# Altium footprint library CUSTOM PCB.PcbLib: 404 footprints (part 16 of 26)
Each footprint in its own frame and in the unit in brackets; x right, y up, seen from the top. Pads: shape width x height; smd on the part's side, far side on the other; paste and mask are expansions set on the pad; w line width, h text height; cw(c..) or ccw(c..) is an arc to the next point about the centre after c.
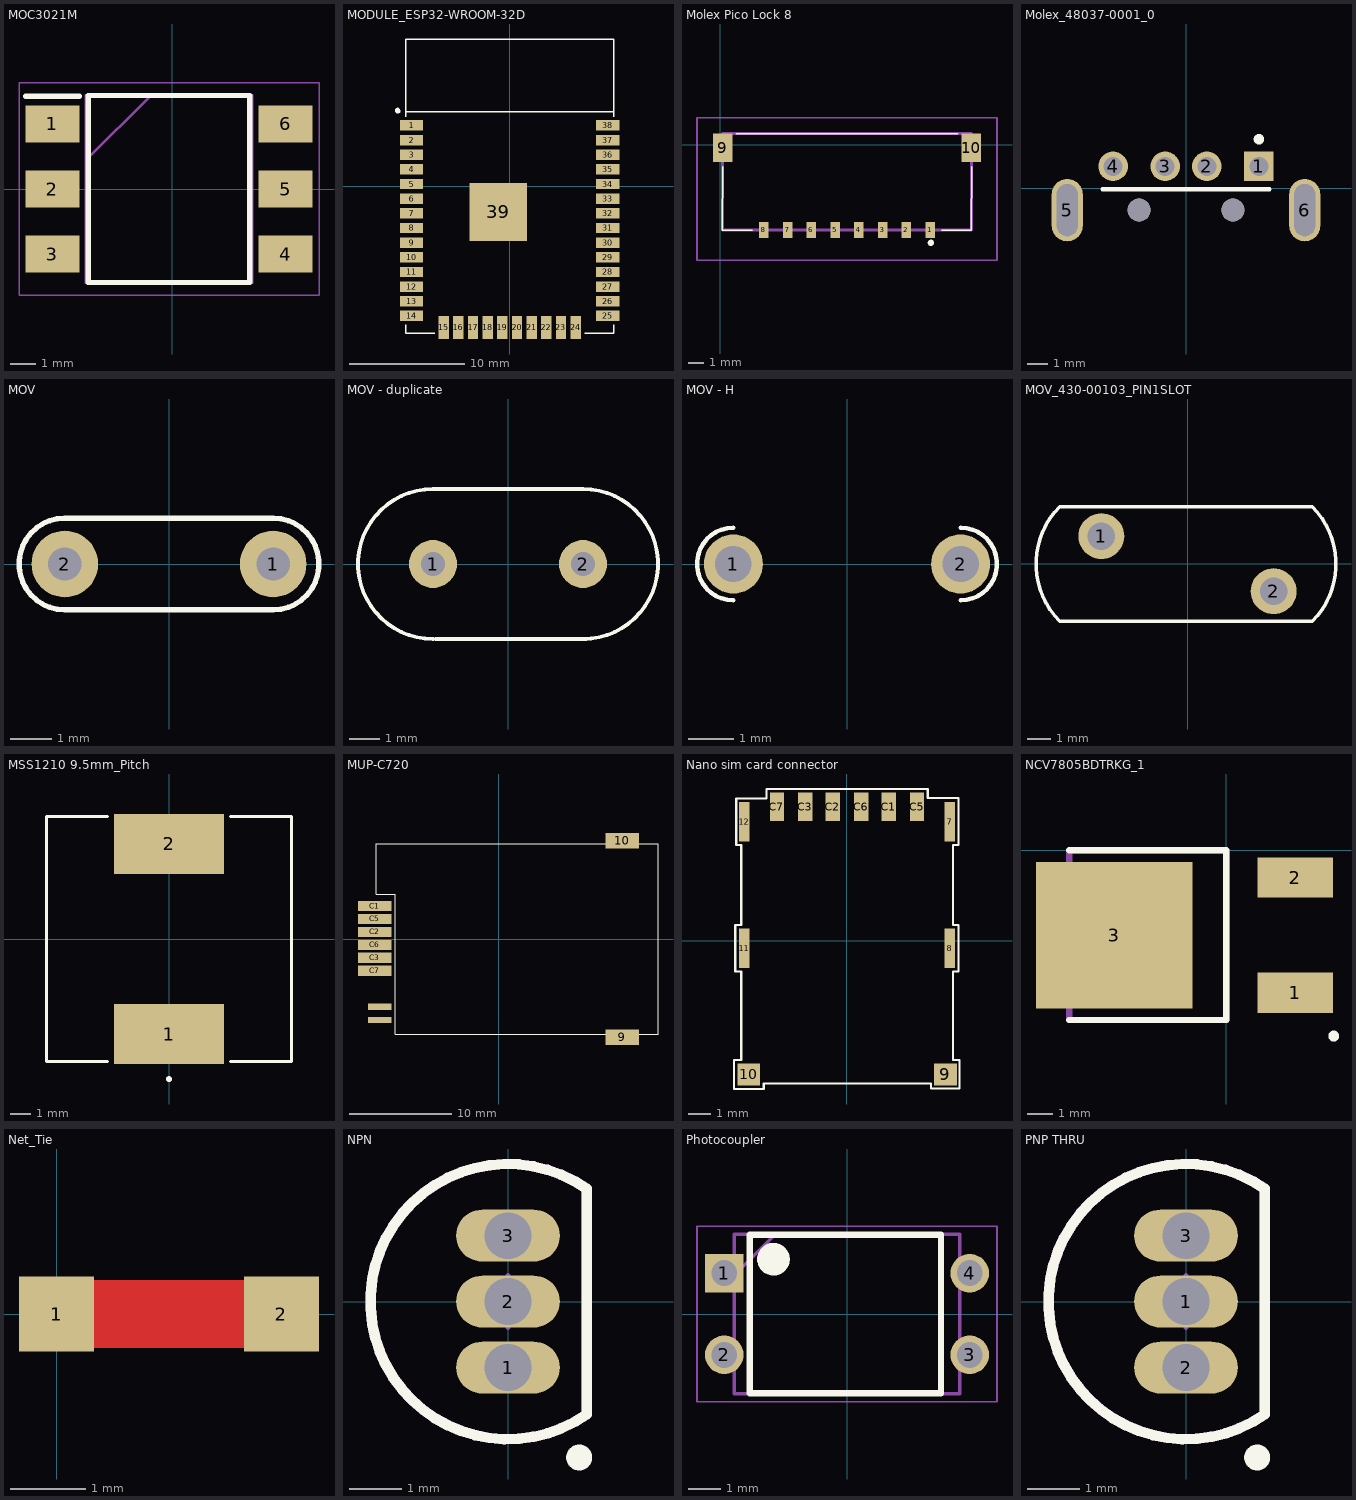
[diagram p15: the footprints below, top view; thin cyan lines are the x and y axes]

## MOC3021M [mm] "Smd Package Lite on"
pads (6):
  rect 2.1x1.45 smd: 1(-4.677,2.54) 2(-4.677,0) 3(-4.677,-2.54) 4(4.423,-2.54) 5(4.423,0) 6(4.423,2.54)
Top Overlay:
  lines w0.2: -5.727,3.615 -3.627,3.615 ; -3.277,-3.65 -3.277,3.65 3.023,3.65 3.023,-3.65 -3.277,-3.65
Mechanical 15:
  lines w0.1: -3.377,1.11 -0.837,3.65 ; -3.377,-3.65 -3.377,3.65 3.123,3.65 3.123,-3.65 -3.377,-3.65
Mechanical 20:
  lines w0.05: -5.977,-4.15 -5.977,4.15 5.723,4.15 5.723,-4.15 -5.977,-4.15
3D body "MOC3021S.stp": height 4, standoff 0, extent -5.08,-3.65 5.08,3.65

## MODULE_ESP32-WROOM-32D [mm]
pads (39):
  rect 2x0.9 smd: 1(-8.5,5.26) 2(-8.5,3.99) 3(-8.5,2.72) 4(-8.5,1.45) 5(-8.5,0.18) 6(-8.5,-1.09) 7(-8.5,-2.36) 8(-8.5,-3.63) 9(-8.5,-4.9) 10(-8.5,-6.17) 11(-8.5,-7.44) 12(-8.5,-8.71) 13(-8.5,-9.98) 14(-8.5,-11.25) 25(8.5,-11.25) 26(8.5,-9.98) 27(8.5,-8.71) 28(8.5,-7.44) 29(8.5,-6.17) 30(8.5,-4.9) 31(8.5,-3.63) 32(8.5,-2.36) 33(8.5,-1.09) 34(8.5,0.18) 35(8.5,1.45) 36(8.5,2.72) 37(8.5,3.99) 38(8.5,5.26)
  rect 0.9x2 smd: 15(-5.715,-12.25) 16(-4.445,-12.25) 17(-3.175,-12.25) 18(-1.905,-12.25) 19(-0.635,-12.25) 20(0.635,-12.25) 21(1.905,-12.25) 22(3.175,-12.25) 23(4.445,-12.25) 24(5.715,-12.25)
  rect 5x5 smd: 39(-1,-2.24)
Top Overlay:
  lines w0.127: -9,-12 -9,-12.75 -6.5,-12.75 ; -9,6 -9,12.75 9,12.75 9,6 ; -8.96,6.45 8.96,6.45 ; 6.5,-12.75 9,-12.75 9,-12
  lines w0.3: -9.649,6.634 ccw(c-9.691,6.543) -9.591,6.543
Top Paste:
  region: -2.584,-0.659 0.581,-0.659 0.581,-3.825 -2.584,-3.825
3D body "ESP32-WROOM-32D--3DModel-STEP-56544.STEP": height 3.25, standoff 0, extent -8.949,-12.75 9.051,12.75

## Molex Pico Lock 8 [mm]
pads (10):
  rect 0.6x1 smd: 1(13.251,-5.384) 2(11.751,-5.384) 3(10.251,-5.384) 4(8.751,-5.384) 5(7.251,-5.384) 6(5.751,-5.384) 7(4.251,-5.384) 8(2.751,-5.384)
  rect 1.25x1.8 smd: 9(0.146,-0.194) 10(15.856,-0.194)
Top Overlay:
  lines w0.1: 0.146,-1.394 0.126,-5.384 2.001,-5.394 ; 1.001,0.706 15.001,0.706 ; 14.001,-5.394 15.856,-5.394 15.876,-1.394
  lines w0.2: 13.201,-6.194 ccw(c13.301,-6.194) 13.401,-6.194 ccw(c13.301,-6.194) 13.201,-6.194
Mechanical 15:
  lines w0.2: 0.126,-5.394 0.126,0.706 15.876,0.706 15.876,-5.394 0.126,-5.394
Mechanical 20:
  lines w0.1: -1.479,-7.294 -1.479,1.706 17.481,1.706 17.481,-7.294 -1.479,-7.294
3D body "5040500891.stp": height 1.89, standoff -0.11, extent -0.274,-5.588 16.276,0.852

## Molex_48037-0001_0 [mm]
pads (8):
  rect 1.42x1.42 hole 0.92 paste-1000 mask+0: 1(3.5,1.05)
  round 1.42 hole 0.92 paste-1000 mask+0: 2(1,1.05) 3(-1,1.05) 4(-3.5,1.05)
  oval 1.5x3 hole 1 slot 2.5 at 90 deg paste-1000 mask+0: 5(-5.7,-1.05) 6(5.7,-1.05)
  round 1.1 hole 1.1 unplated paste-1000 mask+0: ""(-2.25,-1.05) ""(2.25,-1.05)
Top Overlay:
  circle w0.25: c3.5,2.35 r0.125
  lines w0.2: -4,-0.05 4,-0.05
3D body "14380.x_t": height 3, standoff -2.8, extent -6.303,-18.763 6.303,1.162

## MOV [mm]
pads (2):
  round 1.6 hole 0.8: 1(2.5,0) 2(-2.5,0)
Top Overlay:
  lines w0.127: -2.5,-1.1 cw(c-2.5,0) -2.5,1.1 2.5,1.1 cw(c2.5,0) 2.5,-1.1 -2.5,-1.1

## MOV - duplicate [mm]
pads (2):
  round 1.6 hole 0.8: 1(-2.5,0) 2(2.5,0)
Top Overlay:
  lines w0.127: -2.5,-2.5 cw(c-2.5,0) -2.5,2.5 2.5,2.5 cw(c2.5,0) 2.5,-2.5 ; -2.4,-2.5 2.6,-2.5

## MOV - H [mm]
pads (2):
  round 1.3 hole 0.8: 1(-2.5,0) 2(2.5,0)
Top Overlay:
  lines w0.1: -2.5,-0.8 cw(c-2.5,0) -2.5,0.8 ; 2.5,-0.8 ccw(c2.5,0) 2.5,0.8

## MOV_430-00103_PIN1SLOT [mm]
pads (2):
  round 2 hole 1.2: 1(-3.75,1.2) 2(3.75,-1.2)
Top Overlay:
  lines w0.15: -5.57,2.477 ccw(c-3.075,-0.013) -5.565,-2.507 5.435,-2.507 ccw(c2.94,-0.018) 5.43,2.477 -5.57,2.477
Mechanical 15:
  text "1" at -3.75,0.946 h0.64
  text "2" at 3.75,-1.454 h0.64

## MSS1210 9.5mm_Pitch [mil]
pads (2):
  rect 217x118 smd: 1(0,-187.5) 2(0,187.5)
Top Overlay:
  circle w6: c0,-276.5 r3
  lines w6: -121.6,-242 -242,-242 -242,242 -121.6,242 ; 121.6,-242 242,-242 242,242 121.6,242
3D body "Coilcraft-MSS1210.x_t": height 400, standoff -1.38, extent -242.12,-242.12 242.12,242.12

## MUP-C720 [mm]
pads (10):
  rect 2.3x0.6 smd: 7(-11.651,-6.655) 8(-11.651,-7.955)
  rect 3.3x1.5 smd: 9(12.151,-9.635) 10(12.151,9.635)
  rect 3.3x1 smd: C1(-12.151,3.235) C2(-12.151,0.695) C3(-12.151,-1.845) C5(-12.151,1.965) C6(-12.151,-0.575) C7(-12.151,-3.115)
Top Overlay:
  lines w0.05: 2.369,-9.355 -7.291,-9.355 -10.149,-9.355 ; -10.149,-9.355 -10.149,0.075 -10.149,4.395 -11.999,4.395 -11.999,9.355 -10.149,9.355 15.651,9.355 15.651,0.075 15.651,-9.355 -10.149,-9.355
3D body: height 1.8, standoff 0, extent -11.999,-9.355 15.651,9.355

## Nano sim card connector [mm]
pads (12):
  rect 0.48x1.8 smd: 7(4.665,5.4) 8(4.665,-0.35) 11(-4.665,-0.35) 12(-4.665,5.4)
  rect 1.03x1 smd: 9(4.47,-6.07) 10(-4.46,-6.07)
  rect 0.65x1.3 smd: C1(1.9,6.07) C2(-0.64,6.07) C3(-1.9,6.07) C5(3.18,6.07) C6(0.64,6.07) C7(-3.18,6.07)
Top Overlay:
  lines w0.1: -5.126,-6.732 -5.126,-5.411 -4.796,-5.411 -4.796,-1.398 -5.075,-1.398 -5.075,0.711 -4.796,0.711 -4.796,4.343 -5.024,4.343 -5.024,6.146 -5.024,6.451 -4.643,6.451 -3.653,6.451 -3.653,6.883 3.663,6.883 3.663,6.476 5.06,6.476 5.06,4.343 4.806,4.343 4.806,0.711 5.06,0.711 5.06,-1.398 4.806,-1.398 4.806,-5.411 5.11,-5.411 5.11,-6.706 3.815,-6.706 3.815,-6.478 -3.78,-6.478 -3.78,-6.732 -5.126,-6.732
3D body "693043020611 (rev1).stp": height 1.2, standoff -0.01, extent -4.745,-6.43 4.755,6.07

## NCV7805BDTRKG_1 [mm]
pads (3):
  rect 3x1.6 smd: 1(2.74,-5.65) 2(2.74,-1.08)
  rect 6.2x5.8 smd: 3(-4.44,-3.365)
Top Overlay:
  circle w0.254: c4.269,-7.368 r0.089
  lines w0.254: -6.22,-6.73 0,-6.73 0,0 -6.22,0
Mechanical 15:
  lines w0.254: -6.22,-6.73 -6.22,0 0,0 0,-6.73 -6.22,-6.73
3D body "D-PAK.step": height 2.3, standoff -0.01, extent -7.356,-6.581 2.344,-0.001

## Net_Tie [mm]
pads (2):
  rect 1x1 smd: 1(0,0) 2(3,0)
Top Layer:
  lines w0.9: 0,0 3,0

## NPN [mm]
pads (3):
  oval 2x1 hole 0.9: 1(0,-1.27) 2(0,0) 3(0,1.27)
Top Overlay:
  circle w0.25: c1.371,-3.003 r0.125
  lines w0.2: 1.52,-2.171 cw(c0,0) 1.52,2.171 1.52,-2.171
Mechanical 13:
  lines w0.2: 1.52,-2.171 cw(c0,0) 1.52,2.171 1.52,-2.171
Mechanical 15:
  lines w0.1: -0.5,0 0.5,0 ; 0,-0.5 0,0.5
3D body: height 5.33, standoff 0, extent -2.651,-2.661 1.52,2.661

## Photocoupler [mm] "PS2501"
pads (4):
  rect 1.2x1.2 / inner round 1.2 / far side rect 1.2x1.2 hole 0.8: 1(-3.81,1.27)
  round 1.2 hole 0.8: 2(-3.81,-1.27) 3(3.81,-1.27) 4(3.81,1.27)
Top Overlay:
  circle w0.508: c-2.286,1.702 r0.254
  lines w0.2: -3.023,-2.464 -3.023,2.464 2.921,2.464 2.921,-2.464 -2.972,-2.464
Mechanical 15:
  lines w0.1: -3.5,1.205 -2.23,2.475 ; -3.5,-2.475 -3.5,2.475 3.5,2.475 3.5,-2.475 -3.5,-2.475
Mechanical 20:
  lines w0.05: -4.66,-2.725 -4.66,2.725 4.66,2.725 4.66,-2.725 -4.66,-2.725
3D body "PS2501-1-A.stp": height 4.55, standoff -3.5, extent -3.96,-2.3 3.96,2.3

## PNP THRU [mm]
pads (3):
  oval 2x1 hole 0.9: 1(0,0) 2(0,-1.27) 3(0,1.27)
Top Overlay:
  circle w0.25: c1.371,-3.003 r0.125
  lines w0.2: 1.52,-2.171 cw(c0,0) 1.52,2.171 1.52,-2.171
Mechanical 13:
  lines w0.2: 1.52,-2.171 cw(c0,0) 1.52,2.171 1.52,-2.171
Mechanical 15:
  lines w0.1: -0.5,0 0.5,0 ; 0,-0.5 0,0.5
3D body: height 5.33, standoff 0, extent -2.651,-2.661 1.52,2.661